# Altium footprint library jointbar.PCBLIB: 166 footprints (part 10 of 11)
Each footprint in its own frame and in the unit in brackets; x right, y up, seen from the top. Pads: shape width x height; smd on the part's side, far side on the other; paste and mask are expansions set on the pad; w line width, h text height; cw(c..) or ccw(c..) is an arc to the next point about the centre after c.
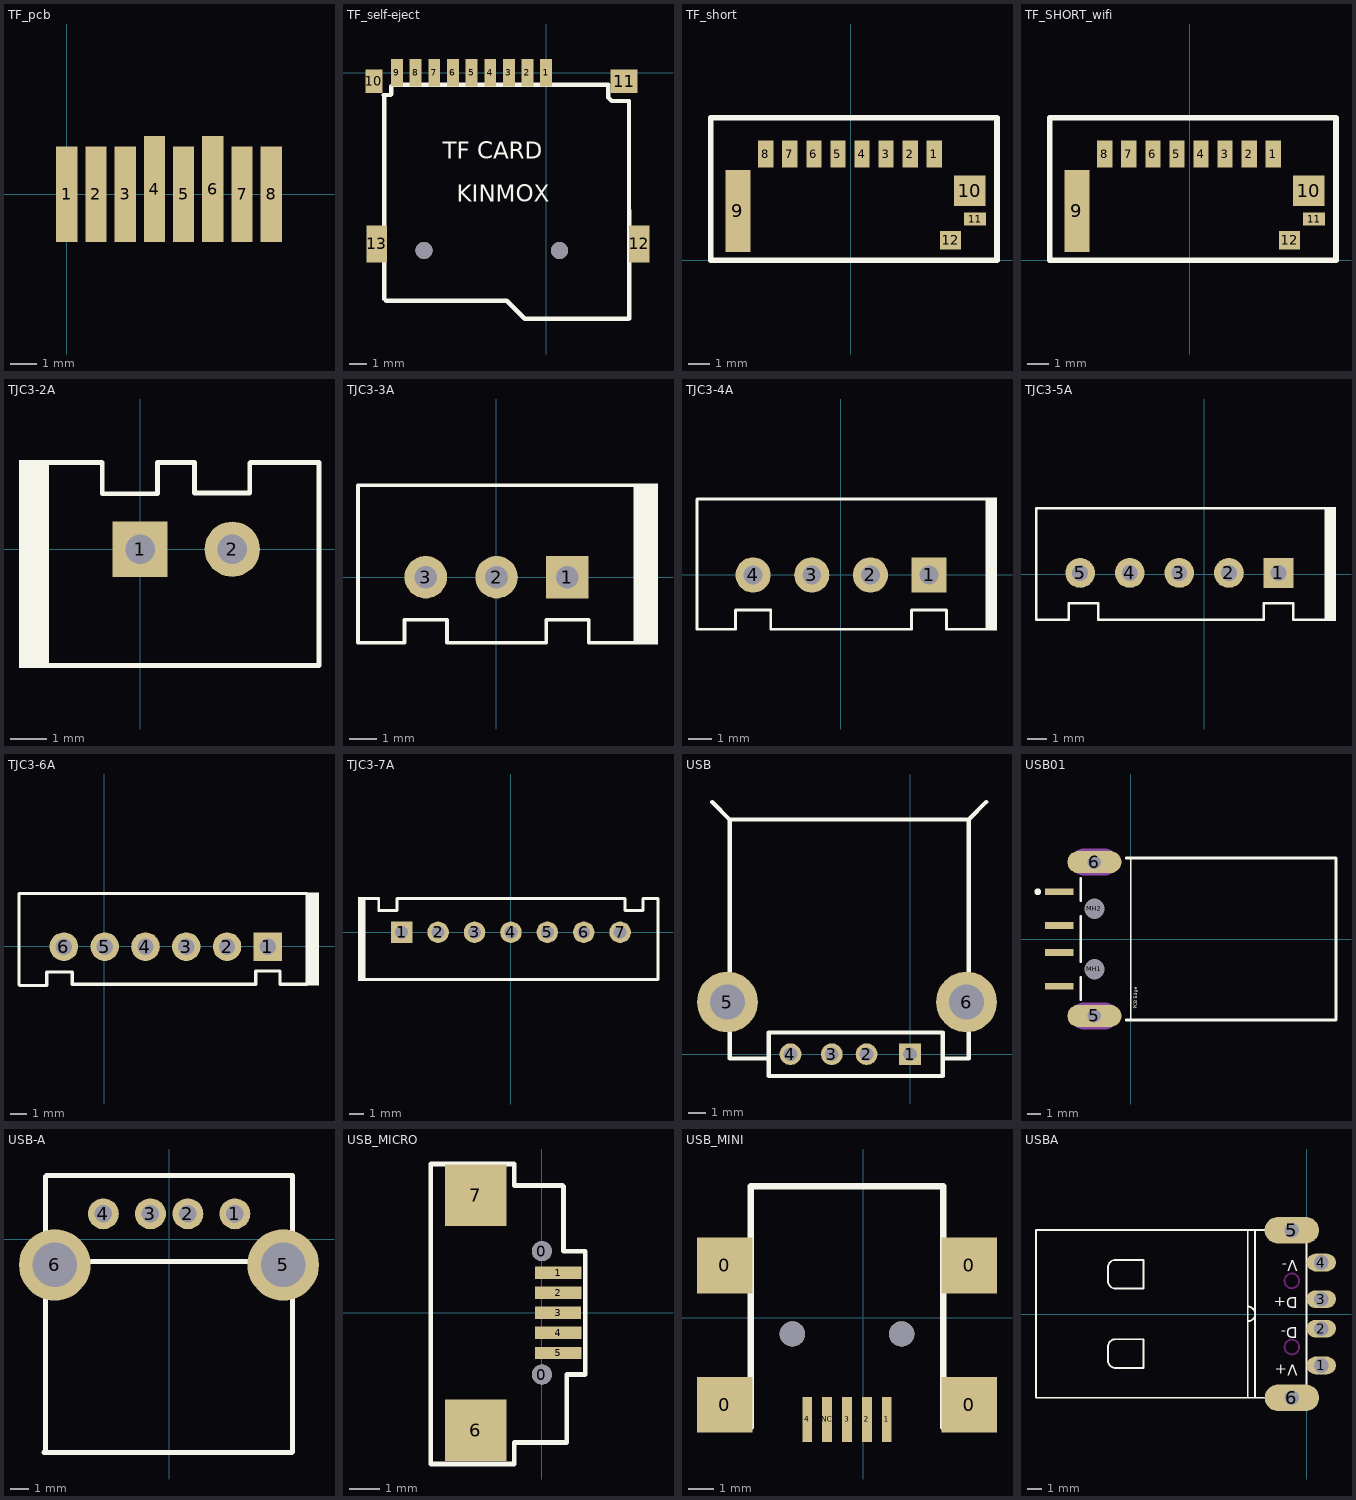
[diagram p9: the footprints below, top view; thin cyan lines are the x and y axes]

## TF_pcb [mm]
pads (8):
  rect 0.8x3.6 smd: 1(0,0) 2(1.1,0) 3(2.2,0) 5(4.4,0) 7(6.6,0) 8(7.7,0)
  rect 0.8x4 smd: 4(3.3,0.2) 6(5.5,0.2)

## TF_self-eject [mm]
pads (13):
  rect 0.7x1.6 smd: 1(0,0) 2(-1.1,0) 3(-2.2,0) 4(-3.3,0) 5(-4.4,0) 6(-5.5,0) 7(-6.6,0) 8(-7.7,0) 9(-8.8,0)
  rect 1x1.4 smd: 10(-10.16,-0.508)
  rect 1.6x1.4 smd: 11(4.6,-0.5)
  rect 1.2x2.2 smd: 12(5.5,-10.1) 13(-10,-10.1)
via -7.2,-10.5 diameter 1 hole 1
via 0.8,-10.5 diameter 1 hole 1
TopOverlay:
  lines w0.254: 4.88,-14.52 -1.262,-14.52 -2.329,-13.453 -9.441,-13.453 -9.543,-13.351 -9.543,-1.362 -9.594,-1.312 -9.187,-1.312 -9.136,-1.261 -9.136,-0.804 -9.035,-0.702 3.665,-0.702 3.665,-1.464 3.868,-1.667 4.884,-1.667 4.9,-14.5
  text "KINMOX" at -5.276,-7.611 h1
  text "TF CARD" at -6.088,-5.071 h1
3D body "SW3dPS-Micro_SD.STEP": height 1.75, standoff 0.77, extent -8.5,-17.1 2.5,-2.1
3D body "User Library-MEM2055-00-190-01-A_revG.STEP": height 1.85, standoff -0.6, extent -10.2,-14.525 5.8,0.725

## TF_short [mm]
pads (12):
  rect 0.7x1.25 smd: 1(3.825,4.85) 2(2.725,4.85) 3(1.625,4.85) 4(0.525,4.85) 5(-0.575,4.85) 6(-1.675,4.85) 7(-2.775,4.85) 8(-3.875,4.85)
  rect 1.15x3.75 smd: 9(-5.15,2.25)
  rect 1.45x1.4 smd: 10(5.45,3.175)
  rect 1x0.6 smd: 11(5.7,1.875)
  rect 0.95x0.85 smd: 12(4.575,0.9)
TopOverlay:
  lines w0.254: -6.4,0 -6.4,6.5 6.7,6.5 6.7,0 -6.4,0
3D body "SW3dPS-Micro_SD.STEP": height 3.95, standoff 2.97, extent -5.425,-9.4 5.575,5.6
3D body: height 3, standoff 0, extent -5.8,0.3 6.6,5.6
3D body: height 3.8, standoff 3.75, extent -5.8,0.3 6.6,5.6
3D body: height 3.8, standoff 0, extent -5.9,0.3 -5.8,5.6
3D body: height 3.8, standoff 0, extent 6.6,0.3 6.7,5.6

## TF_SHORT_wifi [mm]
pads (12):
  rect 0.7x1.25 smd: 1(3.825,4.85) 2(2.725,4.85) 3(1.625,4.85) 4(0.525,4.85) 5(-0.575,4.85) 6(-1.675,4.85) 7(-2.775,4.85) 8(-3.875,4.85)
  rect 1.15x3.75 smd: 9(-5.15,2.25)
  rect 1.45x1.4 smd: 10(5.45,3.175)
  rect 1x0.6 smd: 11(5.7,1.875)
  rect 0.95x0.85 smd: 12(4.575,0.9)
TopOverlay:
  lines w0.254: -6.4,0 -6.4,6.5 6.7,6.5 6.7,0 -6.4,0
3D body: height 3, standoff 0, extent -5.8,0.3 6.6,5.6
3D body: height 4, standoff 3.75, extent -5.8,0.3 6.6,5.6
3D body: height 3.8, standoff 0, extent -5.9,0.3 -5.8,5.6
3D body: height 3.8, standoff 0, extent 6.6,0.3 6.7,5.6
3D body "esp_p.step": height 4.8, standoff 3.39, extent -7.1,-20.212 6.6,5.6

## TJC3-2A [mil]
pads (2):
  rect 60x60 hole 32: 1(0,0)
  round 60 hole 32: 2(100,0)
TopOverlay:
  region: -98.84,96.5 -131.17,96.5 -131.17,-128.5 -98.84,-128.5
  lines w5: -105,-126 194,-126 194,94 119.48,94 ; -104,94 -87,94 -41,94 -41,60 19,60 19,94 59,94 59,61 119,61 119,93.52

## TJC3-3A [mil]
pads (3):
  rect 60x60 hole 32: 1(100.17,0)
  round 60 hole 32: 2(0.17,0) 3(-99.83,0)
TopOverlay:
  rectangle: 195.84,-95.1 228.17,132.4
  lines w5: -195.5,-92.52 -129.83,-92.52 -129.83,-60 -69.83,-60 -69.83,-92.52 70.17,-92.52 70.17,-60 130.17,-60 130.17,-92.52 195.84,-92.52 195.84,129.92 -195.5,129.92 -195.5,-92.52

## TJC3-4A [mil]
pads (4):
  rect 60x60 hole 32: 1(150.28,0)
  round 60 hole 32: 2(50.27,0) 3(-49.73,0) 4(-149.72,0)
TopOverlay:
  rectangle: 246,-95 266,132.5
  lines w5: 245.94,-92.52 180.28,-92.52 180.28,-60 120.28,-60 120.28,-92.52 -119.72,-92.52 -119.72,-60 -179.72,-60 -179.72,-92.52 -245.4,-92.52 -245.4,129.92 245.94,129.92

## TJC3-5A [mil]
pads (5):
  rect 60x60 hole 32: 1(149.5,2.5)
  round 60 hole 32: 2(49.5,2.5) 3(-50.5,2.5) 4(-150.5,2.5) 5(-250.5,2.5)
TopOverlay:
  rectangle: 245.17,-94 265.5,134.9
  lines w5: -214,-91.5 -214,-58.98 -273.5,-58.98 -273.5,-91.5 -339.17,-91.5 -339.17,132.09 -339.5,132.42 -246.17,132.42 245.17,132.42 245.17,-90.02 ; -213,-91.5 -120.5,-91.5 119.5,-91.5 ; 119.5,-90.02 119.5,-58.98 179.5,-58.98 179.5,-91.5 245.17,-91.5

## TJC3-6A [mil]
pads (6):
  rect 70x70 hole 40: 1(400.67,-0.92)
  round 70 hole 40: 2(300.67,-0.92) 3(200.67,-0.92) 4(100.67,-0.92) 5(0.67,-0.92) 6(-99.33,-0.92)
TopOverlay:
  rectangle: 496.34,-96 526,131.5
  lines w8: -209.33,-94.92 -209.33,128.67 ; -209.33,129 5,129 496.34,129 496.34,-93.44 430.67,-93.44 430.67,-60.92 370.67,-60.92 370.67,-93.44 ; -208,-96 -141,-96 -141,-63.48 ; -140,-63 -80,-63 ; -79,-64 -79,-93 367.59,-93

## TJC3-7A [mm]
pads (7):
  rect 1.5x1.5 hole 0.9: 1(-7.62,0)
  round 1.5 hole 0.9: 2(-5.08,0) 3(-2.54,0) 4(0,0) 5(2.54,0) 6(5.08,0) 7(7.62,0)
TopOverlay:
  rectangle: -10.668,-3.404 -10.262,2.464
  lines w0.203: -10.262,-3.302 10.262,-3.302 10.262,2.362 9.22,2.362 9.22,1.524 7.95,1.524 7.95,2.362 -7.95,2.362 -7.95,1.524 -9.22,1.524 -9.22,2.362 -10.262,2.362 -10.262,-3.302

## USB [mil]
pads (6):
  rect 50x50 hole 32: 1(0,0)
  round 50 hole 32: 2(-100,0) 3(-180,0) 4(-275,0)
  round 140 hole 80: 5(-420,120) 6(130,120)
TopOverlay:
  lines w10: -455,580 -415,540 ; -325,-10 -415,-10 -415,540 ; 75,-10 135,-10 135,540 ; 175,580 135,540 ; -415,540 135,540 ; -325,-50 75,-50 75,50 -325,50 -325,-50

## USB01 [mm] "Connector; USB1.1, Type A, SM; 4 Position; Right Angle"
height 4.5
pads (8):
  rect 2.1x0.5 smd: 1(-5.3,3.5) 2(-5.3,1) 3(-5.3,-1) 4(-5.3,-3.5)
  oval 4x1.65 hole 1: 5(-2.7,-5.7) 6(-2.7,5.7)
  round 1.2 hole 1.5 unplated: MH1(-2.7,-2.25) MH2(-2.7,2.25)
TopOverlay:
  circle w0.25: c-6.9,3.5 r0.125
  lines w0.1: 0,-6 0,6
  lines w0.2: -3.7,-4.475 -3.7,-2.83 ; -3.7,-1.68 -3.7,1.68 ; -3.7,2.83 -3.7,4.475 ; -0.33,-6 15.2,-6 15.2,6 -0.33,6
  text "PCB Edge" at 0.473,-5.173 h0.25
Mechanical1:
  lines w1: -3.45,-5.7 -1.95,-5.7 ; -3.45,5.7 -1.95,5.7
Mechanical2:
  lines w2.016: -3.45,-5.7 -1.95,-5.7 ; -3.45,5.7 -1.95,5.7

## USB-A [mil]
pads (6):
  round 65 hole 37: 1(138,53.5) 2(39.5,53.5) 3(-39,53.5) 4(-137.6,53.5)
  round 150 hole 93: 5(239.31,-53.5) 6(-239.31,-53.5)
TopOverlay:
  lines w10: -182,-46.5 178,-46.5 ; -262,-446.5 258,-446.5 259,-445.5 259,-53.5 259,133.5 -257,133.5 -259,131.5 -259,-53.5 -259,-423.5 -259,-443.5 -262,-446.5

## USB_MICRO [mm]
pads (9):
  round 0.65 hole 0.65: 0(0,-2) 0(0,2)
  rect 1.5x0.4 smd: 1(0.525,1.3) 2(0.525,0.65) 3(0.521,0) 4(0.525,-0.65) 5(0.525,-1.3)
  rect 2x2 smd: 6(-2.15,-3.81) 7(-2.15,3.81)
TopOverlay:
  lines w0.152: 0.674,4.126 -0.9,4.126 -0.9,4.826 -3.6,4.826 -3.6,-4.9 -2.15,-4.9 -0.9,-4.9 -0.9,-4.2 0.8,-4.2 0.8,-2 1.4,-2 1.4,2 0.7,2 0.7,4.1
Mechanical13:
  text ".Designator" at -1.246,-1.554 h0.51
Mechanical15:
  text ".Comment" at -1.246,-1.554 h0.51
3D body "MICRO USB.STEP": height 2.77, standoff -0.17, extent -4.645,-4.083 1.285,4.117

## USB_MINI [mil]
pads (11):
  rect 86.61x86.61 smd: 0(-215,-135) 0(-215,81.54) 0(165,-135) 0(165,81.54)
  rect 15x70 smd: 1(37,-158) 2(6,-158) 3(-25,-158) 4(-87,-158) NC(-56,-158)
  round 39.37 hole 39.37 paste+0: ""(-110,-25.04) ""(60,-25.04)
TopOverlay:
  lines w10: -175,-170 -175,205 125,205 125,-170

## USBA [mm]
pads (6):
  oval 2x1.2 hole 1: 1(0.995,-3.5) 2(0.999,-0.997) 3(0.999,1.007) 4(1.002,3.5)
  oval 3.7x1.8 hole 1: 5(-1.002,5.698) 6(-0.999,-5.698)
TopOverlay:
  lines w0.127: -4.002,-5.695 -4.002,5.705 ; -4.002,-0.495 ccw(c-4.002,0.005) -4.002,0.505 ; -3.502,-5.695 -3.502,5.705 ; -2.402,-5.695 -18.402,-5.695 -18.402,5.705 -2.402,5.705 ; -0.002,-5.205 -0.002,5.215 ; -13.502,-3.17 ccw(c-13.002,-3.17) -13.002,-3.67 -11.102,-3.67 -11.102,-1.72 -13.002,-1.72 ccw(c-13.002,-2.22) -13.502,-2.22 -13.502,-3.17 ; -13.502,2.23 ccw(c-13.002,2.23) -13.002,1.73 -11.102,1.73 -11.102,3.68 -13.002,3.68 ccw(c-13.002,3.18) -13.502,3.18 -13.502,2.23
  text "D-" at -0.59,-0.625 h1.27
  text "V-" at -0.59,3.941 h1.27
  text "V+" at -0.59,-3.171 h1.27
  text "D+" at -0.59,1.401 h1.27
KeepOutLayer:
  circle w0.127: c-1.002,2.255 r0.5
  circle w0.127: c-1.002,-2.245 r0.5
  lines w0.127: -1.902,-6.195 cw(c-1.902,-5.695) -1.902,-5.195 -0.102,-5.195 cw(c-0.102,-5.695) -0.102,-6.195 -1.902,-6.195 ; -1.902,5.205 cw(c-1.902,5.705) -1.902,6.205 -0.102,6.205 cw(c-0.102,5.705) -0.102,5.205 -1.902,5.205